# Altium footprint library GyokuRe.PcbLib: 1248 footprints (part 70 of 78)
Each footprint in its own frame and in the unit in brackets; x right, y up, seen from the top. Pads: shape width x height; smd on the part's side, far side on the other; paste and mask are expansions set on the pad; w line width, h text height; cw(c..) or ccw(c..) is an arc to the next point about the centre after c.
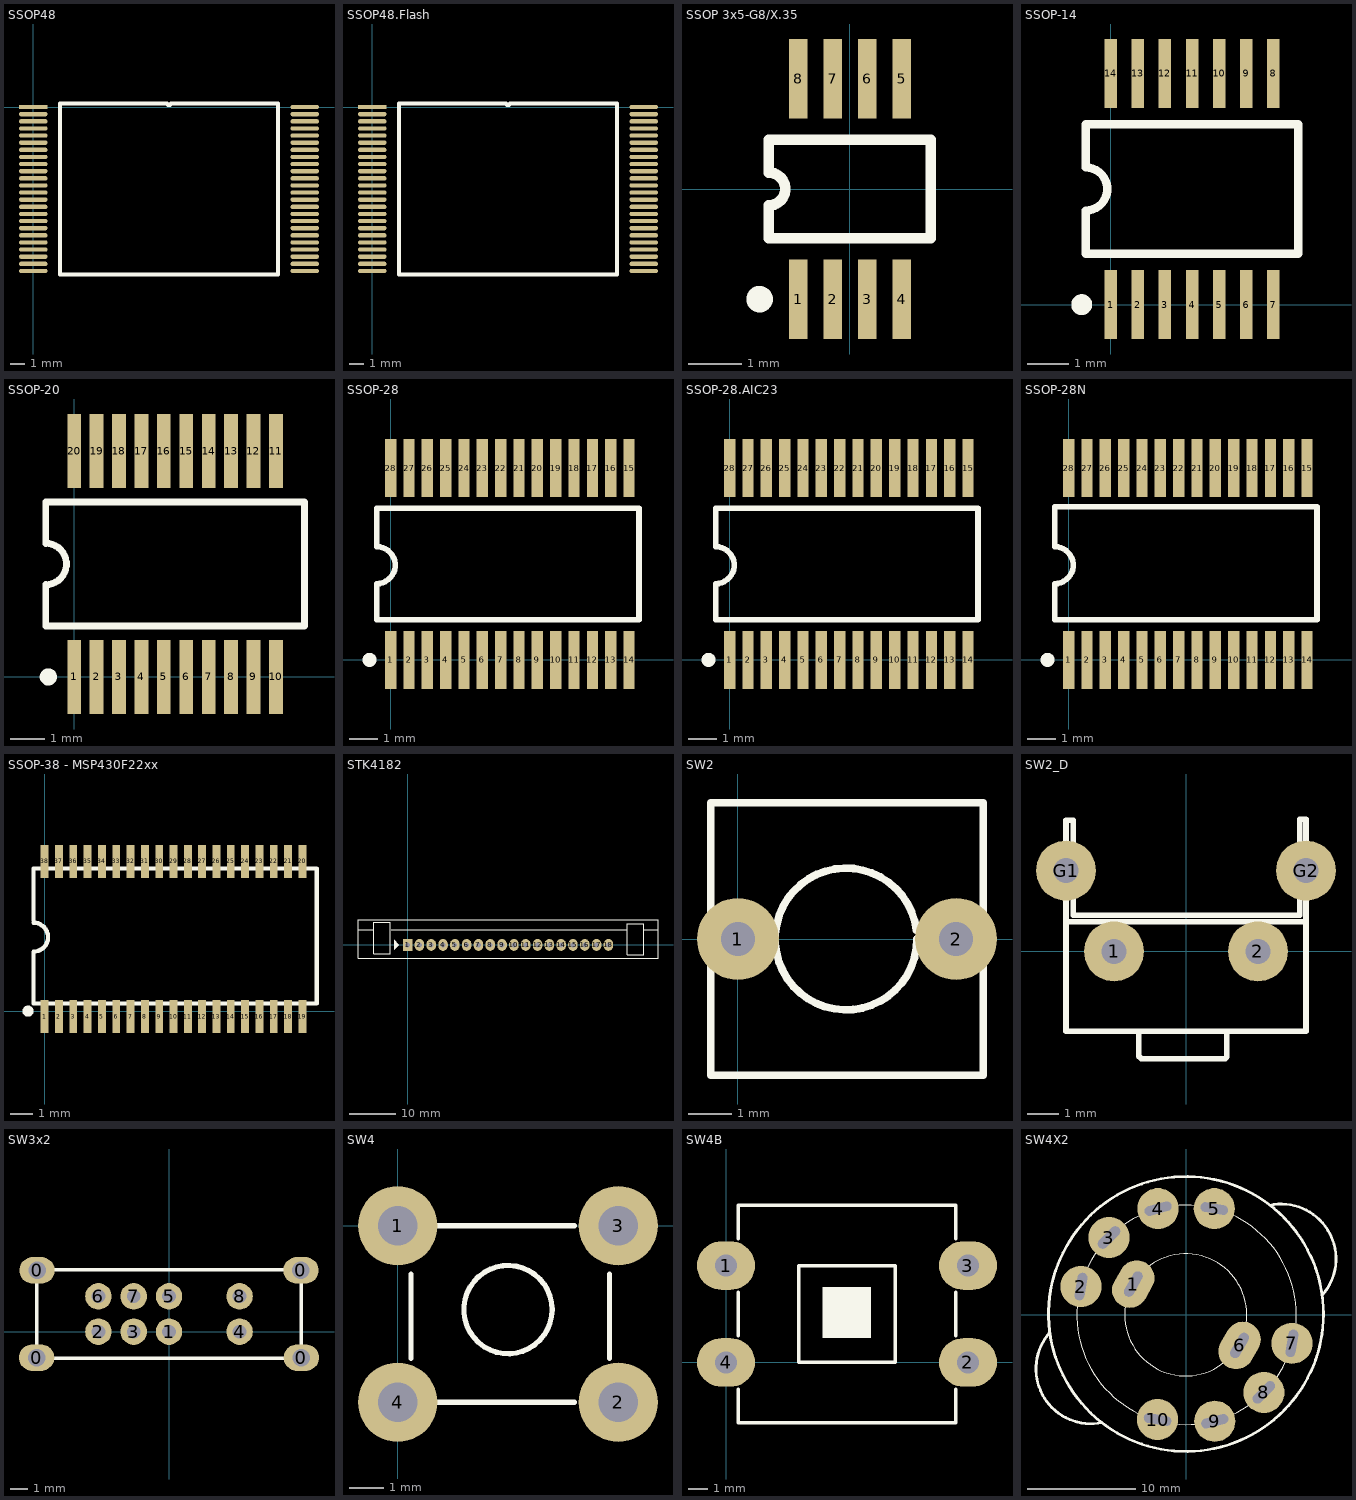
[diagram p69: the footprints below, top view; thin cyan lines are the x and y axes]

## SSOP48 [mil]
pads (48):
  rect 80x12.2 smd: 1(0,0)
  oval 80x12.2 smd: 2(0,-20) 3(0,-40) 4(0,-60) 5(0,-80) 6(0,-100) 7(0,-120) 8(0,-140) 9(0,-160) 10(0,-180) 11(0,-200) 12(0,-220) 13(0,-240) 14(0,-260) 15(0,-280) 16(0,-300) 17(0,-320) 18(0,-340) 19(0,-360) 20(0,-380) 21(0,-400) 22(0,-420) 23(0,-440) 24(0,-460) 25(762,-460) 26(762,-440) 27(762,-420) 28(762,-400) 29(762,-380) 30(762,-360) 31(762,-340) 32(762,-320) 33(762,-300) 34(762,-280) 35(762,-260) 36(762,-240) 37(762,-220) 38(762,-200) 39(762,-180) 40(762,-160) 41(762,-140) 42(762,-120) 43(762,-100) 44(762,-80) 45(762,-60) 46(762,-40) 47(762,-20) 48(762,0)
Top Overlay:
  lines w10: 75,-470 75,10 376,10 ccw(c381,10) 386,10 687,10 687,-470 75,-470
3D body: height 3.94, standoff 0.2, extent 745,-5 775,5
3D body: height 3.94, standoff 0.2, extent -15,-5 15,5
3D body: height 3.94, standoff 0.2, extent 745,-25 775,-15
3D body: height 3.94, standoff 0.2, extent 745,-45 775,-35
3D body: height 3.94, standoff 0.2, extent 745,-105 775,-95
3D body: height 3.94, standoff 0.2, extent 745,-85 775,-75
3D body: height 3.94, standoff 0.2, extent 745,-65 775,-55
3D body: height 3.94, standoff 0.2, extent 745,-165 775,-155
3D body: height 3.94, standoff 0.2, extent 745,-145 775,-135
3D body: height 3.94, standoff 0.2, extent 745,-125 775,-115
3D body: height 3.94, standoff 0.2, extent 745,-225 775,-215
3D body: height 3.94, standoff 0.2, extent 745,-205 775,-195
3D body: height 3.94, standoff 0.2, extent 745,-185 775,-175
3D body: height 3.94, standoff 0.2, extent 745,-285 775,-275
3D body: height 3.94, standoff 0.2, extent 745,-265 775,-255
3D body: height 3.94, standoff 0.2, extent 745,-245 775,-235
3D body: height 3.94, standoff 0.2, extent 745,-345 775,-335
3D body: height 3.94, standoff 0.2, extent 745,-325 775,-315
3D body: height 3.94, standoff 0.2, extent 745,-305 775,-295
3D body: height 3.94, standoff 0.2, extent 745,-405 775,-395
3D body: height 3.94, standoff 0.2, extent 745,-385 775,-375
3D body: height 3.94, standoff 0.2, extent 745,-365 775,-355
3D body: height 3.94, standoff 0.2, extent 745,-465 775,-455
3D body: height 3.94, standoff 0.2, extent 745,-445 775,-435
3D body: height 3.94, standoff 0.2, extent 745,-425 775,-415
3D body: height 3.94, standoff 0.2, extent -15,-25 15,-15
3D body: height 3.94, standoff 0.2, extent -15,-65 15,-55
3D body: height 3.94, standoff 0.2, extent -15,-45 15,-35
3D body: height 3.94, standoff 0.2, extent -15,-125 15,-115
3D body: height 3.94, standoff 0.2, extent -15,-145 15,-135
3D body: height 3.94, standoff 0.2, extent -15,-105 15,-95
3D body: height 3.94, standoff 0.2, extent -15,-85 15,-75
3D body: height 3.94, standoff 0.2, extent -15,-205 15,-195
3D body: height 3.94, standoff 0.2, extent -15,-225 15,-215
3D body: height 3.94, standoff 0.2, extent -15,-185 15,-175
3D body: height 3.94, standoff 0.2, extent -15,-165 15,-155
3D body: height 3.94, standoff 0.2, extent -15,-285 15,-275
3D body: height 3.94, standoff 0.2, extent -15,-305 15,-295
3D body: height 3.94, standoff 0.2, extent -15,-265 15,-255
3D body: height 3.94, standoff 0.2, extent -15,-245 15,-235
3D body: height 3.94, standoff 0.2, extent -15,-365 15,-355
3D body: height 3.94, standoff 0.2, extent -15,-385 15,-375
3D body: height 3.94, standoff 0.2, extent -15,-345 15,-335
3D body: height 3.94, standoff 0.2, extent -15,-325 15,-315
3D body: height 3.94, standoff 0.2, extent -15,-445 15,-435
3D body: height 3.94, standoff 0.2, extent -15,-465 15,-455
3D body: height 3.94, standoff 0.2, extent -15,-425 15,-415
3D body: height 3.94, standoff 0.2, extent -15,-405 15,-395
3D body: height 47.24, standoff 1.97, extent 15,-470 745,10
3D body: height 47.64, standoff 46.85, extent 42.47,-46.67 72.47,-16.67

## SSOP48.Flash [mil]
pads (48):
  rect 80x12.2 smd: 1(0,0)
  oval 80x12.2 smd: 2(0,-20) 3(0,-40) 4(0,-60) 5(0,-80) 6(0,-100) 7(0,-120) 8(0,-140) 9(0,-160) 10(0,-180) 11(0,-200) 12(0,-220) 13(0,-240) 14(0,-260) 15(0,-280) 16(0,-300) 17(0,-320) 18(0,-340) 19(0,-360) 20(0,-380) 21(0,-400) 22(0,-420) 23(0,-440) 24(0,-460) 25(762,-460) 26(762,-440) 27(762,-420) 28(762,-400) 29(762,-380) 30(762,-360) 31(762,-340) 32(762,-320) 33(762,-300) 34(762,-280) 35(762,-260) 36(762,-240) 37(762,-220) 38(762,-200) 39(762,-180) 40(762,-160) 41(762,-140) 42(762,-120) 43(762,-100) 44(762,-80) 45(762,-60) 46(762,-40) 47(762,-20) 48(762,0)
Top Overlay:
  lines w10: 75,-470 75,10 376,10 ccw(c381,10) 386,10 687,10 687,-470 75,-470
3D body: height 3.94, standoff 0.2, extent 745,-5 775,5
3D body: height 3.94, standoff 0.2, extent -15,-5 15,5
3D body: height 3.94, standoff 0.2, extent 745,-25 775,-15
3D body: height 3.94, standoff 0.2, extent 745,-45 775,-35
3D body: height 3.94, standoff 0.2, extent 745,-105 775,-95
3D body: height 3.94, standoff 0.2, extent 745,-85 775,-75
3D body: height 3.94, standoff 0.2, extent 745,-65 775,-55
3D body: height 3.94, standoff 0.2, extent 745,-165 775,-155
3D body: height 3.94, standoff 0.2, extent 745,-145 775,-135
3D body: height 3.94, standoff 0.2, extent 745,-125 775,-115
3D body: height 3.94, standoff 0.2, extent 745,-225 775,-215
3D body: height 3.94, standoff 0.2, extent 745,-205 775,-195
3D body: height 3.94, standoff 0.2, extent 745,-185 775,-175
3D body: height 3.94, standoff 0.2, extent 745,-285 775,-275
3D body: height 3.94, standoff 0.2, extent 745,-265 775,-255
3D body: height 3.94, standoff 0.2, extent 745,-245 775,-235
3D body: height 3.94, standoff 0.2, extent 745,-345 775,-335
3D body: height 3.94, standoff 0.2, extent 745,-325 775,-315
3D body: height 3.94, standoff 0.2, extent 745,-305 775,-295
3D body: height 3.94, standoff 0.2, extent 745,-405 775,-395
3D body: height 3.94, standoff 0.2, extent 745,-385 775,-375
3D body: height 3.94, standoff 0.2, extent 745,-365 775,-355
3D body: height 3.94, standoff 0.2, extent 745,-465 775,-455
3D body: height 3.94, standoff 0.2, extent 745,-445 775,-435
3D body: height 3.94, standoff 0.2, extent 745,-425 775,-415
3D body: height 3.94, standoff 0.2, extent -15,-25 15,-15
3D body: height 3.94, standoff 0.2, extent -15,-65 15,-55
3D body: height 3.94, standoff 0.2, extent -15,-45 15,-35
3D body: height 3.94, standoff 0.2, extent -15,-125 15,-115
3D body: height 3.94, standoff 0.2, extent -15,-145 15,-135
3D body: height 3.94, standoff 0.2, extent -15,-105 15,-95
3D body: height 3.94, standoff 0.2, extent -15,-85 15,-75
3D body: height 3.94, standoff 0.2, extent -15,-205 15,-195
3D body: height 3.94, standoff 0.2, extent -15,-225 15,-215
3D body: height 3.94, standoff 0.2, extent -15,-185 15,-175
3D body: height 3.94, standoff 0.2, extent -15,-165 15,-155
3D body: height 3.94, standoff 0.2, extent -15,-285 15,-275
3D body: height 3.94, standoff 0.2, extent -15,-305 15,-295
3D body: height 3.94, standoff 0.2, extent -15,-265 15,-255
3D body: height 3.94, standoff 0.2, extent -15,-245 15,-235
3D body: height 3.94, standoff 0.2, extent -15,-365 15,-355
3D body: height 3.94, standoff 0.2, extent -15,-385 15,-375
3D body: height 3.94, standoff 0.2, extent -15,-345 15,-335
3D body: height 3.94, standoff 0.2, extent -15,-325 15,-315
3D body: height 3.94, standoff 0.2, extent -15,-445 15,-435
3D body: height 3.94, standoff 0.2, extent -15,-465 15,-455
3D body: height 3.94, standoff 0.2, extent -15,-425 15,-415
3D body: height 3.94, standoff 0.2, extent -15,-405 15,-395
3D body: height 47.24, standoff 1.97, extent 15.75,-470.47 746.06,9.84
3D body: height 47.28, standoff 46.85, extent 42.47,-46.67 72.47,-16.67
3D body: height 47.28, standoff 46.85, extent 334.65,-316.93 384.84,-247.05
3D body: height 47.28, standoff 46.85, extent 363.19,-218.5 413.39,-148.62
3D body: height 47.28, standoff 46.85, extent 243.11,-218.5 293.31,-148.62
3D body: height 47.28, standoff 46.85, extent 303.15,-218.5 353.35,-148.62
3D body: height 47.28, standoff 46.85, extent 423.23,-218.5 473.43,-148.62
3D body: height 47.28, standoff 46.85, extent 483.27,-218.5 533.46,-148.62
3D body: height 47.28, standoff 46.85, extent 284.45,-316.93 313.98,-247.05
3D body: height 47.28, standoff 46.85, extent 394.69,-316.93 444.88,-247.05
3D body: height 47.28, standoff 46.85, extent 454.72,-316.93 503.94,-247.05

## SSOP 3x5-G8/X.35 [mm] "Shrink Small Outline; 8 Leads; Body Width 3 mm; Pitch 0.65 mm"
pads (8):
  rect 0.35x1.5 smd: 1(-0.975,-2.075) 2(-0.325,-2.075) 3(0.325,-2.075) 4(0.975,-2.075) 5(0.975,2.075) 6(0.325,2.075) 7(-0.325,2.075) 8(-0.975,2.075)
Top Overlay:
  circle w0.25: c-1.7,-2.075 r0.125
  lines w0.2: -1.525,-0.925 1.525,-0.925 1.525,0.925 -1.525,0.925 -1.525,0.308 cw(c-1.525,0) -1.525,-0.308 -1.525,-0.925

## SSOP-14 [mm] "Shrink Small Outline, Plastic, Thin; 14 Leads; Body Width 4.4 mm; Pitch 0.65 mm"
height 1.1
pads (14):
  rect 0.3x1.65 smd: 1(0,0) 2(0.65,0) 3(1.3,0) 4(1.95,0) 5(2.6,0) 6(3.25,0) 7(3.9,0) 8(3.9,5.55) 9(3.25,5.55) 10(2.6,5.55) 11(1.95,5.55) 12(1.3,5.55) 13(0.65,5.55) 14(0,5.55)
Top Overlay:
  circle w0.25: c-0.7,0 r0.125
  lines w0.2: -0.6,1.225 4.5,1.225 4.5,4.325 -0.6,4.325 -0.6,3.292 cw(c-0.6,2.775) -0.6,2.258 -0.6,1.225

## SSOP-20 [mm] "SSOP, Plastic; 20 Leads; Body Width 5.3 mm; Pitch 0.65 mm"
height 1.99
pads (20):
  rect 0.4x2.15 smd: 1(0,0) 2(0.65,0) 3(1.3,0) 4(1.95,0) 5(2.6,0) 6(3.25,0) 7(3.9,0) 8(4.55,0) 9(5.2,0) 10(5.85,0) 11(5.85,6.55) 12(5.2,6.55) 13(4.55,6.55) 14(3.9,6.55) 15(3.25,6.55) 16(2.6,6.55) 17(1.95,6.55) 18(1.3,6.55) 19(0.65,6.55) 20(0,6.55)
Top Overlay:
  circle w0.25: c-0.75,0 r0.125
  lines w0.2: -0.825,1.475 -0.825,2.675 ccw(c-0.825,3.275) -0.825,3.875 -0.825,5.075 6.675,5.075 6.675,1.475 -0.825,1.475
3D body "SSOP_20.STEP": height 1.79, standoff -0.05, extent -0.75,-0.675 6.55,7.225

## SSOP-28 [mm] "SSOP, Plastic; 28 Leads; Body Width 5.2 mm; Pitch 0.65 mm"
height 1.99
pads (28):
  rect 0.4x2.05 smd: 1(0,0) 2(0.65,0) 3(1.3,0) 4(1.95,0) 5(2.6,0) 6(3.25,0) 7(3.9,0) 8(4.55,0) 9(5.2,0) 10(5.85,0) 11(6.5,0) 12(7.15,0) 13(7.8,0) 14(8.45,0) 15(8.45,6.8) 16(7.8,6.8) 17(7.15,6.8) 18(6.5,6.8) 19(5.85,6.8) 20(5.2,6.8) 21(4.55,6.8) 22(3.9,6.8) 23(3.25,6.8) 24(2.6,6.8) 25(1.95,6.8) 26(1.3,6.8) 27(0.65,6.8) 28(0,6.8)
Top Overlay:
  circle w0.25: c-0.75,0 r0.125
  lines w0.2: -0.5,4.017 cw(c-0.5,3.358) -0.5,2.7 -0.5,1.425 8.8,1.425 8.8,5.375 -0.5,5.375 -0.5,4.1
3D body: height 1.2, standoff 0.15, extent -0.7,1.15 9.1,5.65
3D body: height 0.1, standoff 0, extent -0.15,0.1 0.15,1.2
3D body: height 0.1, standoff 0, extent 0.5,0.1 0.8,1.2
3D body: height 0.1, standoff 0, extent 1.15,0.1 1.45,1.2
3D body: height 0.1, standoff 0, extent 1.8,0.1 2.1,1.2
3D body: height 0.1, standoff 0, extent 4.4,0.1 4.7,1.2
3D body: height 0.1, standoff 0, extent 3.75,0.1 4.05,1.2
3D body: height 0.1, standoff 0, extent 3.1,0.1 3.4,1.2
3D body: height 0.1, standoff 0, extent 2.45,0.1 2.75,1.2
3D body: height 0.1, standoff 0, extent 7,0.1 7.3,1.2
3D body: height 0.1, standoff 0, extent 6.35,0.1 6.65,1.2
3D body: height 0.1, standoff 0, extent 5.7,0.1 6,1.2
3D body: height 0.1, standoff 0, extent 5.05,0.1 5.35,1.2
3D body: height 0.1, standoff 0, extent 8.3,0.1 8.6,1.2
3D body: height 0.1, standoff 0, extent 7.65,0.1 7.95,1.2
3D body: height 0.1, standoff 0, extent 6.35,5.6 6.65,6.7
3D body: height 0.1, standoff 0, extent 7,5.6 7.3,6.7
3D body: height 0.1, standoff 0, extent 7.65,5.6 7.95,6.7
3D body: height 0.1, standoff 0, extent 8.3,5.6 8.6,6.7
3D body: height 0.1, standoff 0, extent 3.75,5.6 4.05,6.7
3D body: height 0.1, standoff 0, extent 4.4,5.6 4.7,6.7
3D body: height 0.1, standoff 0, extent 5.05,5.6 5.35,6.7
3D body: height 0.1, standoff 0, extent 5.7,5.6 6,6.7
3D body: height 0.1, standoff 0, extent 1.15,5.6 1.45,6.7
3D body: height 0.1, standoff 0, extent 1.8,5.6 2.1,6.7
3D body: height 0.1, standoff 0, extent 2.45,5.6 2.75,6.7
3D body: height 0.1, standoff 0, extent 3.1,5.6 3.4,6.7
3D body: height 0.1, standoff 0, extent -0.15,5.6 0.15,6.7
3D body: height 0.1, standoff 0, extent 0.5,5.6 0.8,6.7
3D body: height 1.2, standoff 1.19, extent 6.5,2.525 7.775,4.3
3D body: height 1.2, standoff 1.19, extent 4.975,2.525 6.25,4.3
3D body: height 1.2, standoff 1.19, extent 3.475,2.525 4.725,4.3
3D body: height 1.2, standoff 1.19, extent 2.2,2.525 2.95,4.3
3D body: height 1.2, standoff 1.19, extent 0.675,2.525 1.95,4.3

## SSOP-28.AIC23 [mm] "SSOP, Plastic; 28 Leads; Body Width 5.2 mm; Pitch 0.65 mm"
height 1.99
pads (28):
  rect 0.4x2.05 smd: 1(0,0) 2(0.65,0) 3(1.3,0) 4(1.95,0) 5(2.6,0) 6(3.25,0) 7(3.9,0) 8(4.55,0) 9(5.2,0) 10(5.85,0) 11(6.5,0) 12(7.15,0) 13(7.8,0) 14(8.45,0) 15(8.45,6.8) 16(7.8,6.8) 17(7.15,6.8) 18(6.5,6.8) 19(5.85,6.8) 20(5.2,6.8) 21(4.55,6.8) 22(3.9,6.8) 23(3.25,6.8) 24(2.6,6.8) 25(1.95,6.8) 26(1.3,6.8) 27(0.65,6.8) 28(0,6.8)
Top Overlay:
  circle w0.25: c-0.75,0 r0.125
  lines w0.2: -0.5,4.017 cw(c-0.5,3.358) -0.5,2.7 -0.5,1.425 8.8,1.425 8.8,5.375 -0.5,5.375 -0.5,4.1
3D body: height 0.1, standoff 0, extent 0.5,5.6 0.8,6.7
3D body: height 0.1, standoff 0, extent -0.15,5.6 0.15,6.7
3D body: height 0.1, standoff 0, extent 3.1,5.6 3.4,6.7
3D body: height 0.1, standoff 0, extent 2.45,5.6 2.75,6.7
3D body: height 0.1, standoff 0, extent 1.8,5.6 2.1,6.7
3D body: height 0.1, standoff 0, extent 1.15,5.6 1.45,6.7
3D body: height 0.1, standoff 0, extent 5.7,5.6 6,6.7
3D body: height 0.1, standoff 0, extent 5.05,5.6 5.35,6.7
3D body: height 0.1, standoff 0, extent 4.4,5.6 4.7,6.7
3D body: height 0.1, standoff 0, extent 3.75,5.6 4.05,6.7
3D body: height 0.1, standoff 0, extent 8.3,5.6 8.6,6.7
3D body: height 0.1, standoff 0, extent 7.65,5.6 7.95,6.7
3D body: height 0.1, standoff 0, extent 7,5.6 7.3,6.7
3D body: height 0.1, standoff 0, extent 6.35,5.6 6.65,6.7
3D body: height 0.1, standoff 0, extent 7.65,0.1 7.95,1.2
3D body: height 0.1, standoff 0, extent 8.3,0.1 8.6,1.2
3D body: height 0.1, standoff 0, extent 5.05,0.1 5.35,1.2
3D body: height 0.1, standoff 0, extent 5.7,0.1 6,1.2
3D body: height 0.1, standoff 0, extent 6.35,0.1 6.65,1.2
3D body: height 0.1, standoff 0, extent 7,0.1 7.3,1.2
3D body: height 0.1, standoff 0, extent 2.45,0.1 2.75,1.2
3D body: height 0.1, standoff 0, extent 3.1,0.1 3.4,1.2
3D body: height 0.1, standoff 0, extent 3.75,0.1 4.05,1.2
3D body: height 0.1, standoff 0, extent 4.4,0.1 4.7,1.2
3D body: height 0.1, standoff 0, extent 1.8,0.1 2.1,1.2
3D body: height 0.1, standoff 0, extent 1.15,0.1 1.45,1.2
3D body: height 0.1, standoff 0, extent 0.5,0.1 0.8,1.2
3D body: height 0.1, standoff 0, extent -0.15,0.1 0.15,1.2
3D body: height 1.2, standoff 0.15, extent -0.7,1.15 9.1,5.65
3D body: height 1.2, standoff 1.19, extent 0.675,2.525 1.95,4.3
3D body: height 1.2, standoff 1.19, extent 2.2,2.525 2.95,4.3
3D body: height 1.2, standoff 1.19, extent 3.475,2.525 4.725,4.3
3D body: height 1.2, standoff 1.19, extent 4.975,2.525 6.25,4.3
3D body: height 1.2, standoff 1.19, extent 6.5,2.525 7.775,4.3

## SSOP-28N [mm] "SSOP, Plastic; 28 Leads; Body Width 5.2 mm; Pitch 0.65 mm"
height 1.99
pads (28):
  rect 0.4x2.05 smd: 1(0,0) 2(0.65,0) 3(1.3,0) 4(1.95,0) 5(2.6,0) 6(3.25,0) 7(3.9,0) 8(4.55,0) 9(5.2,0) 10(5.85,0) 11(6.5,0) 12(7.15,0) 13(7.8,0) 14(8.45,0) 15(8.45,6.8) 16(7.8,6.8) 17(7.15,6.8) 18(6.5,6.8) 19(5.85,6.8) 20(5.2,6.8) 21(4.55,6.8) 22(3.9,6.8) 23(3.25,6.8) 24(2.6,6.8) 25(1.95,6.8) 26(1.3,6.8) 27(0.65,6.8) 28(0,6.8)
Top Overlay:
  circle w0.25: c-0.75,0 r0.125
  lines w0.2: -0.5,4.017 cw(c-0.5,3.358) -0.5,2.7 -0.5,1.425 8.8,1.425 8.8,5.375 ; -0.5,4.1 -0.5,5.375 ; -0.5,5.425 8.8,5.425
3D body "SSOP-28.STEP": height 1.92, standoff -0.03, extent -1.025,-0.725 9.475,7.5

## SSOP-38 - MSP430F22xx [mm] "SSOP, Plastic; 38 Leads; Body Width 5.2 mm; Pitch 0.65 mm"
height 1.99
pads (38):
  rect 0.356x1.5 smd: 1(0,-0.25) 2(0.65,-0.25) 3(1.3,-0.25) 4(1.95,-0.25) 5(2.6,-0.25) 6(3.25,-0.25) 7(3.9,-0.25) 8(4.55,-0.25) 9(5.2,-0.25) 10(5.85,-0.25) 11(6.5,-0.25) 12(7.15,-0.25) 13(7.8,-0.25) 14(8.45,-0.25) 15(9.1,-0.25) 16(9.75,-0.25) 17(10.4,-0.25) 18(11.05,-0.25) 19(11.7,-0.25) 20(11.7,6.8) 21(11.05,6.8) 22(10.4,6.8) 23(9.75,6.8) 24(9.1,6.8) 25(8.45,6.8) 26(7.8,6.8) 27(7.15,6.8) 28(6.5,6.8) 29(5.85,6.8) 30(5.2,6.8) 31(4.55,6.8) 32(3.9,6.8) 33(3.25,6.8) 34(2.6,6.8) 35(1.95,6.8) 36(1.3,6.8) 37(0.65,6.8) 38(0,6.8)
Top Overlay:
  circle w0.25: c-0.75,0 r0.125
  lines w0.2: -0.5,4.017 cw(c-0.5,3.358) -0.5,2.7 -0.5,0.35 12.35,0.35 12.35,6.475 -0.5,6.475 -0.5,4.1

## STK4182 [mil] "Pin to pin 100mil, 18 pin"
pads (18):
  rect 80x100 hole 40: 1(0,0)
  oval 80x100 hole 40: 2(100,0) 3(200,0) 4(300,0) 5(400,0) 6(500,0) 7(600,0) 8(700,0) 9(800,0) 10(900,0) 11(1000,0) 12(1100,0) 13(1200,0) 14(1300,0) 15(1400,0) 16(1500,0) 17(1600,0) 18(1700,0)
Top Overlay:
  region: -115,42.5 -115,-42.5 -75,-2.5 -75,2.5
  lines w10: -420,130 -285,130 ; -140,130 1860,130 ; 2000,130 2120,130 ; -420,-115 -420,215 2120,215 2120,-115 -420,-115 ; -285,-75 -145,-75 -145,190 -285,190 -285,-75 ; 1860,-85 1860,180 2000,180 2000,-85 1860,-85

## SW2 [mil] "SW button 2pin, 250x 250 mil"
height 100
pads (2):
  round 75 hole 31: 1(0,0) 2(200,0)
Top Overlay:
  lines w7: 163.64,8.26 ccw(c99.17,0) 164.17,0 ; -25,-125 -25,125 225,125 225,-125 -25,-125

## SW2_D [mil] "SW button 2pin, 300x 300 x 250 mil"
height 100
pads (4):
  round 75 hole 31: 1(-90,0) 2(90,0) G1(-150,101) G2(150,101)
Top Overlay:
  lines w7: -150,37 150,37 ; -59,-100 -59,-131 -56,-134 49,-134 51,-132 51,-100 ; -150,-100 -150,164 -141,164 -141,45 142,45 142,165 150,165 150,-100 -150,-100

## SW3x2 [mil] "Switch 3x2 - pin to pin 80"
height 500
pads (12):
  oval 80x60 hole 40: 0(-300,-59) 0(-299,139) 0(299,139) 0(300,-59)
  round 60 hole 31: 1(0,0) 2(-160,0) 3(-80,0) 4(160,0) 5(0,80) 6(-160,80) 7(-80,80) 8(160,80)
Top Overlay:
  lines w8: -300,-60 300,-60 300,140 -300,140 -300,-60

## SW4 [mil] "SW button 4pin, 250 x250 mil"
height 100
pads (4):
  round 90 hole 45: 1(0,0) 2(250,-200) 3(250,0) 4(0,-200)
Top Overlay:
  circle w6: c125,-95 r50
  lines w6: 15,-150 15,-55 ; 45,0 200,0 ; 46,-200 200,-200 ; 240,-150 240,-55
  lines w7: 239,-215 240,-214
3D body "SW3dPS-.STEP": height 275.59, standoff -137.8, extent -33.51,-233.04 277.52,11.05

## SW4B [mil] "SW button 4pin, 450 x 450 mil"
height 100
pads (4):
  oval 120x100 hole 45: 1(0,200) 2(500,0) 3(500,200) 4(0,0)
Top Overlay:
  rectangle: 199,50 300,156
  lines w7: 25,-55 25,-125 475,-125 475,-55 ; 25,55 25,145 ; 25,255 25,325 475,325 475,255 ; 475,55 475,145 ; 150,0 150,200 350,200 350,0 150,0
3D body "SW3dPS-omron b3w-4000 switch.STEP": height 169.29, standoff -57.09, extent -3.21,-129.22 469.23,343.23

## SW4X2 [mil] "Switch 4x2"
height 500
pads (10):
  oval 180x130 hole 35 slot 100 at 60 deg rot 60: 1(-193.57,112.51) 6(193.7,-111.07)
  round 150 hole 35 slot 100 at 80 deg: 2(-384.48,103.48) 7(384.48,-103.48)
  round 150 hole 35 slot 100 at 45 deg: 3(-282.26,282.26) 8(282.26,-282.26)
  round 150 hole 35 slot 100 at 15 deg: 4(-103.48,387.48) 9(103.48,-387.48)
  round 150 hole 35 slot 100 at 170 deg: 5(101.54,387.46) 10(-105.2,-381.27)
Top Overlay:
  circle w1: c-2.46,0.46 r222.5
  circle w1: c0.54,0.46 r400
  circle w10: c-1.46,3.46 r501
  lines w10: -498,-63.94 ccw(c-348.29,-196.56) -307.65,-392.38 ; 303.52,399.93 cw(c345.18,204.32) 495.11,71.95